# Altium footprint library 3.12-SIM、SD卡.PcbLib: 29 footprints (part 2 of 2)
Each footprint in its own frame and in the unit in brackets; x right, y up, seen from the top. Pads: shape width x height; smd on the part's side, far side on the other; paste and mask are expansions set on the pad; w line width, h text height; cw(c..) or ccw(c..) is an arc to the next point about the centre after c.
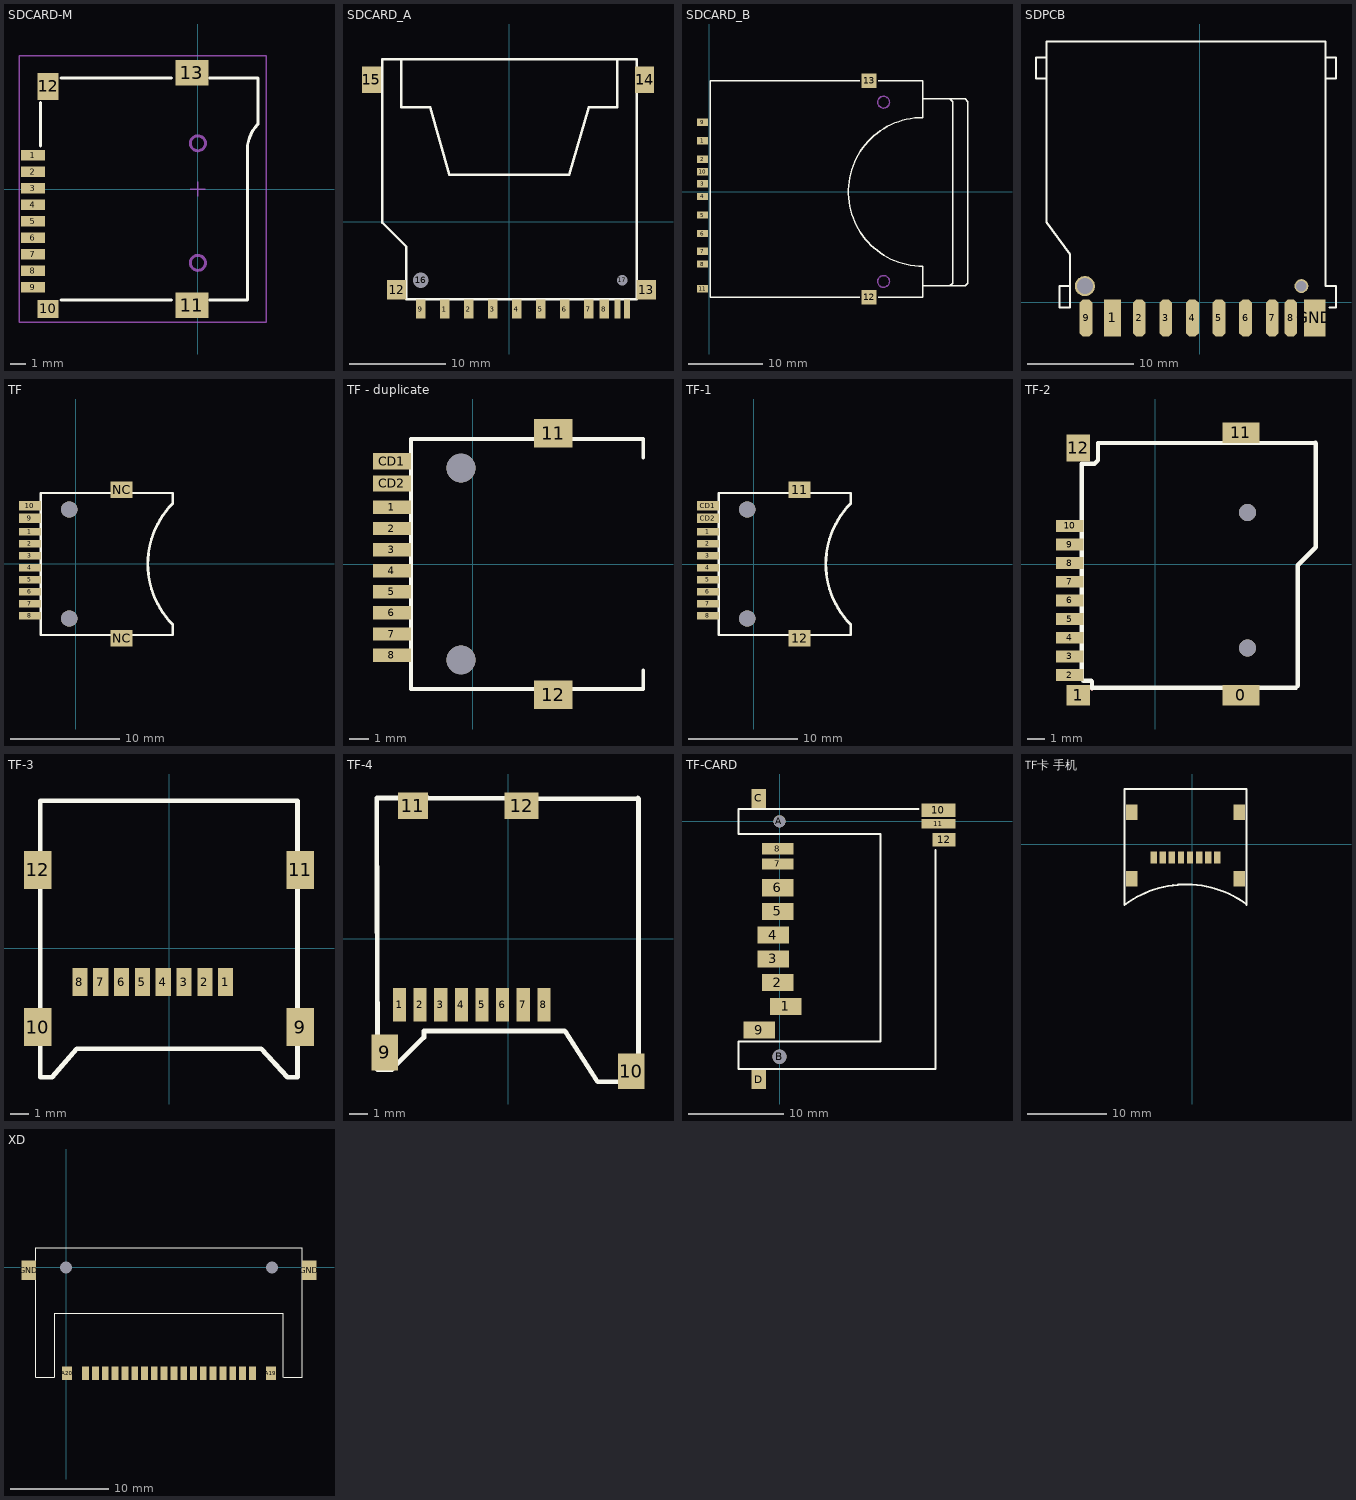
[diagram p1: the footprints below, top view; thin cyan lines are the x and y axes]

## SDCARD-M [mm] "TF卡       淘宝ID:黄晶宝石"
height 1.5
pads (13):
  rect 1.6x0.7 smd: 1(-11.008,2.25) 2(-11.008,1.15) 3(-11.008,0.05) 4(-11.008,-1.05) 5(-11.008,-2.15) 6(-11.008,-3.25) 7(-11.008,-4.35) 8(-11.008,-5.45) 9(-11.008,-6.55)
  rect 1.4x1.2 smd: 10(-10,-8.004)
  rect 2.2x1.7 smd: 11(-0.4,-7.75) 13(-0.4,7.75)
  rect 1.4x1.8 smd: 12(-10,6.85)
Top Overlay:
  lines w0.2: -10.5,2.88 -10.5,5.756 ; -9.144,-7.4 -1.778,-7.4 ; -9.144,7.4 -1.778,7.4 ; 0.762,-7.4 3.3,-7.4 3.3,1.016 ; 0.762,7.4 4,7.4 4,4.318 ccw(c5.69,2.628) 3.3,2.628 3.3,0.762
Mechanical 1:
  circle w0.2: c0,-4.93 r0.5
  circle w0.2: c0,3.05 r0.5
Mechanical 15:
  lines w0.1: -0.5,0 0.5,0 ; 0,-0.5 0,0.5 ; -11.938,-8.89 4.572,-8.89 4.572,8.89 -11.938,8.89 -11.938,-8.89

## SDCARD_A [mm] "SD卡不自弹       淘宝ID:黄晶宝石"
pads (17):
  rect 1x2 smd: 1(-6.731,-9.068) 2(-4.231,-9.068) 3(-1.731,-9.068) 4(0.769,-9.068) 5(3.269,-9.068) 6(5.769,-9.068) 7(8.269,-9.068) 8(9.894,-9.068) 9(-9.231,-9.068)
  rect 0.6x2 smd: 10(12.269,-9.068) 11(11.269,-9.068)
  rect 2x2 smd: 12(-11.731,-7.068) 13(14.269,-7.068)
  rect 2x2.8 smd: 14(14.097,14.808) 15(-14.351,14.808)
  round 1.5 hole 1.6: 16(-9.231,-6.068)
  round 1 hole 1.1: 17(11.769,-6.068)
Top Overlay:
  lines w0.254: -11.231,16.932 -11.231,11.932 -8.231,11.932 -6.231,4.932 6.269,4.932 8.269,11.932 11.269,11.932 11.269,16.932 ; -13.231,-0.068 -13.231,16.932 13.269,16.932 13.269,-8.068 -10.731,-8.068 -10.731,-2.568 -13.231,-0.068

## SDCARD_B [mm] "SD卡自弹       淘宝ID:黄晶宝石"
pads (13):
  rect 1.5x1 smd: 1(-0.889,6.88) 2(-0.889,4.38) 3(-0.889,1.08) 4(-0.889,-0.63) 5(-0.889,-3.13) 6(-0.889,-5.63) 7(-0.889,-8.05) 8(-0.889,-9.75) 9(-0.889,9.38) 10(-0.889,2.73) 11(-0.889,-13.1)
  rect 2x2 smd: 12(21.59,-14.224) 13(21.59,14.986)
Top Overlay:
  lines w0.2: 20.32,-14.224 0.127,-14.224 0.127,0 0.127,14.986 20.32,14.986 ; 22.86,-14.224 28.829,-14.224 28.829,-10.033 cw(c28.829,0) 28.829,10.033 28.829,14.986 22.86,14.986 ; 28.829,-12.7 32.893,-12.7 34.544,-12.7 34.925,-12.319 34.925,12.192 34.544,12.573 32.893,12.573 28.829,12.573 ; 32.512,-12.7 32.893,-12.319 32.893,12.192 32.512,12.573
Mechanical 1:
  circle w0.2: c23.55,12.1 r0.8
  circle w0.2: c23.55,-12.1 r0.8

## SDPCB [mm] "淘宝ID:黄晶宝石"
height 0.254
pads (12):
  rect 1.6x3.5 smd: 1(-8.2,-1.5)
  oct 1.2x3.5 smd: 2(-5.7,-1.5) 3(-3.2,-1.5) 4(-0.7,-1.5) 5(1.8,-1.5) 6(4.3,-1.5) 7(6.8,-1.5) 8(8.55,-1.5) 9(-10.7,-1.5)
  rect 2x3.5 smd: GND(10.8,-1.5)
  round 1.9 on Top hole 1.5: ""(-10.8,1.5)
  round 1.3 on Top hole 1: ""(9.55,1.5)
Top Overlay:
  lines w0.203: -14.4,21 -15.4,21 -15.4,23 -14.4,23 ; -12.2,1.5 -13.2,1.5 -13.2,-0.5 -12.2,-0.5 -12.2,4.5 -14.4,7.5 -14.4,24.5 11.8,24.5 11.8,1.524 ; 11.8,1.5 12.8,1.5 12.8,-0.5 12.2,-0.5 ; 11.8,21 12.8,21 12.8,23 11.8,23

## TF [mm] "淘宝ID:黄晶宝石"
pads (14):
  rect 2x0.7 smd: 1(-4.207,2.947) 2(-4.207,1.847) 3(-4.207,0.747) 4(-4.207,-0.353) 5(-4.207,-1.453) 6(-4.207,-2.553) 7(-4.207,-3.653) 8(-4.207,-4.753)
  rect 2x0.85 smd: 9(-4.207,4.197) 10(-4.207,5.347)
  rect 2x1.5 smd: NC(4.193,-6.823) NC(4.193,6.817)
  round 1.5 hole 1.5 unplated: ""(-0.607,-5.003)
  round 1.5 hole 1.5: ""(-0.607,4.997)
Top Overlay:
  lines w0.2: 8.893,-5.553 8.893,-6.518 -3.207,-6.518 -3.207,6.512 8.893,6.512 8.893,5.547
  lines w0.254: 8.893,-5.553 cw(c14.443,-0.003) 8.893,5.547

## TF - duplicate [mm]
pads (14):
  rect 2x0.7 smd: 1(-4.2,2.95) 2(-4.2,1.85) 3(-4.2,0.75) 4(-4.2,-0.35) 5(-4.2,-1.45) 6(-4.2,-2.55) 7(-4.2,-3.65) 8(-4.2,-4.75)
  rect 2x1.5 smd: 11(4.2,6.82) 12(4.2,-6.82)
  rect 2x0.85 smd: CD1(-4.2,5.35) CD2(-4.2,4.2)
  round 1.5 hole 1.5 unplated: ""(-0.6,-5)
  round 1.5 hole 1.5: ""(-0.6,5)
Top Overlay:
  lines w0.2: 8.9,-5.55 8.9,-6.515 -3.2,-6.515 -3.2,6.515 8.9,6.515 8.9,5.55

## TF-1 [mm]
pads (14):
  rect 2x0.7 smd: 1(-4.2,2.95) 2(-4.2,1.85) 3(-4.2,0.75) 4(-4.2,-0.35) 5(-4.2,-1.45) 6(-4.2,-2.55) 7(-4.2,-3.65) 8(-4.2,-4.75)
  rect 2x1.5 smd: 11(4.2,6.82) 12(4.2,-6.82)
  rect 2x0.85 smd: CD1(-4.2,5.35) CD2(-4.2,4.2)
  round 1.5 hole 1.5 unplated: ""(-0.6,-5)
  round 1.5 hole 1.5: ""(-0.6,5)
Top Overlay:
  lines w0.2: 8.9,-5.55 8.9,-6.515 -3.2,-6.515 -3.2,6.515 8.9,6.515 8.9,5.55
  lines w0.254: 8.9,-5.55 cw(c14.45,0) 8.9,5.55

## TF-2 [mm]
pads (13):
  rect 2.2x1.2 smd: 0(5.05,-7.75) 11(5.05,7.75)
  rect 1.4x1.2 smd: 1(-4.55,-7.75)
  rect 1.6x0.7 smd: 2(-5.05,-6.55) 3(-5.05,-5.45) 4(-5.05,-4.35) 5(-5.05,-3.25) 6(-5.05,-2.15) 7(-5.05,-1.05) 8(-5.05,0.05) 9(-5.05,1.15) 10(-5.05,2.25)
  rect 1.4x1.6 smd: 12(-4.55,6.85)
via 5.45,-4.95 diameter 1 hole 1
via 5.45,3.05 diameter 1 hole 1
Top Layer:
  lines w0.254: -3.738,-7.344 -3.688,-7.293
Top Overlay:
  lines w0.254: -3.738,-7.344 -3.738,-6.937 -3.789,-6.886 -4.246,-6.886 -4.348,-6.785 -4.348,5.915 -3.586,5.915 -3.383,6.118 -3.383,7.134 9.45,7.15 ; -3.688,-7.293 8.301,-7.293 8.403,-7.191 8.403,-0.079 9.47,0.988 9.47,7.13

## TF-3 [mm]
pads (12):
  rect 0.8x1.5 smd: 1(2.993,-1.772) 2(1.893,-1.772) 3(0.793,-1.772) 4(-0.307,-1.772) 5(-1.407,-1.772) 6(-2.507,-1.772) 7(-3.607,-1.772) 8(-4.707,-1.772)
  rect 1.45x2 smd: 9(6.925,-4.15) 10(-6.925,-4.15) 11(6.925,4.15) 12(-6.925,4.15)
Top Overlay:
  lines w0.254: -6.805,-6.8 -6.805,7.8 6.795,7.8 6.795,-6.8 6.264,-6.8 4.865,-5.3 -4.875,-5.3 -6.182,-6.8 -6.805,-6.8

## TF-4 [mm]
pads (12):
  rect 0.7x1.8 smd: 1(-5.785,-3.525) 2(-4.685,-3.525) 3(-3.585,-3.525) 4(-2.485,-3.525) 5(-1.385,-3.525) 6(-0.285,-3.525) 7(0.815,-3.525) 8(1.915,-3.525)
  rect 1.4x1.9 smd: 9(-6.575,-6.075) 10(6.575,-7.075)
  rect 1.6x1.4 smd: 11(-5.075,7.075)
  rect 1.8x1.4 smd: 12(0.725,7.075)
Top Overlay:
  lines w0.254: -4.261,7.499 -7.004,7.499 ; 6.864,7.448 -7.004,7.499 ; 6.915,7.499 6.966,7.448 6.966,-7.64 ; 7.017,-7.589 6.966,-7.64 ; -7.004,7.499 -6.953,-6.979 -6.191,-6.979 -4.485,-5.273 -4.485,-4.925 2.935,-4.925 3.032,-4.925 4.781,-7.64 6.966,-7.64

## TF-CARD [mm] "淘宝ID:黄晶宝石"
pads (16):
  rect 3.32x1.8 smd: 1(0.655,-19.487) 2(-0.175,-16.987) 3(-0.645,-14.487) 4(-0.645,-11.987) 5(-0.175,-9.487) 6(-0.175,-6.987) 9(-2.145,-21.987)
  rect 3.32x1.2 smd: 7(-0.175,-4.487) 8(-0.175,-2.862)
  rect 3.6x1.4 smd: 10(16.73,1.163)
  rect 3.6x1 smd: 11(16.73,-0.237)
  rect 2.4x1.4 smd: 12(17.32,-1.937)
  round 1.27 hole 1.27: A(-0.01,0.013)
  round 1.5 hole 1.5: B(-0.01,-24.787)
  rect 1.5x2 smd: C(-2.205,2.413) D(-2.205,-27.187)
Top Overlay:
  lines w0.204: -4.33,1.288 -4.33,-1.307 10.62,-1.307 10.62,-23.187 -4.33,-23.187 -4.33,-26.087 16.42,-26.087 16.42,-2.987 ; -4.33,1.313 14.62,1.313

## TF卡 手机 [mm] "淘宝ID:黄晶宝石"
height 12.75
pads (12):
  rect 0.8x1.5 smd: 1(3.175,-1.651) 2(2.032,-1.651) 3(0.889,-1.651) 4(-0.254,-1.651) 5(-1.397,-1.651) 6(-2.54,-1.651) 7(-3.683,-1.651) 8(-4.826,-1.651)
  rect 1.45x2 smd: ""(-7.62,-4.318) ""(-7.62,4.064) ""(5.969,-4.318) ""(5.969,4.064)
Top Overlay:
  lines w0.254: 6.782,-7.471 ccw(c-0.762,-17.907) -8.509,-7.62 -8.509,6.985 6.858,6.985 6.858,-7.62

## XD [mm] "淘宝ID:黄晶宝石"
pads (24):
  round 0 hole 1.2 unplated: 0(21,0) 1(0,0)
  rect 0.7x1.4 smd: A1(19,-10.8) A2(18,-10.8) A3(17,-10.8) A4(16,-10.8) A5(15,-10.8) A6(14,-10.8) A7(13,-10.8) A8(12,-10.8) A9(11,-10.8) A10(10,-10.8) A11(9,-10.8) A12(8,-10.8) A13(7,-10.8) A14(6,-10.8) A15(5,-10.8) A16(4,-10.8) A17(3,-10.8) A18(2,-10.8)
  rect 1x1.4 smd: A19(20.9,-10.8) A20(0.1,-10.8)
  rect 1.5x2 smd: GND(-3.8,-0.3) GND(24.8,-0.3)
Top Overlay:
  lines w0.127: -1.2,-11.19 -3.1,-11.19 -3.1,2.01 24.1,2.01 24.1,-11.19 22.2,-11.19 ; -1.16,-11.19 -1.16,-4.69 22.14,-4.69 22.14,-11.19